# Altium footprint library ACR Components.PcbLib: 45 footprints (part 1 of 3)
Each footprint in its own frame and in the unit in brackets; x right, y up, seen from the top. Pads: shape width x height; smd on the part's side, far side on the other; paste and mask are expansions set on the pad; w line width, h text height; cw(c..) or ccw(c..) is an arc to the next point about the centre after c.
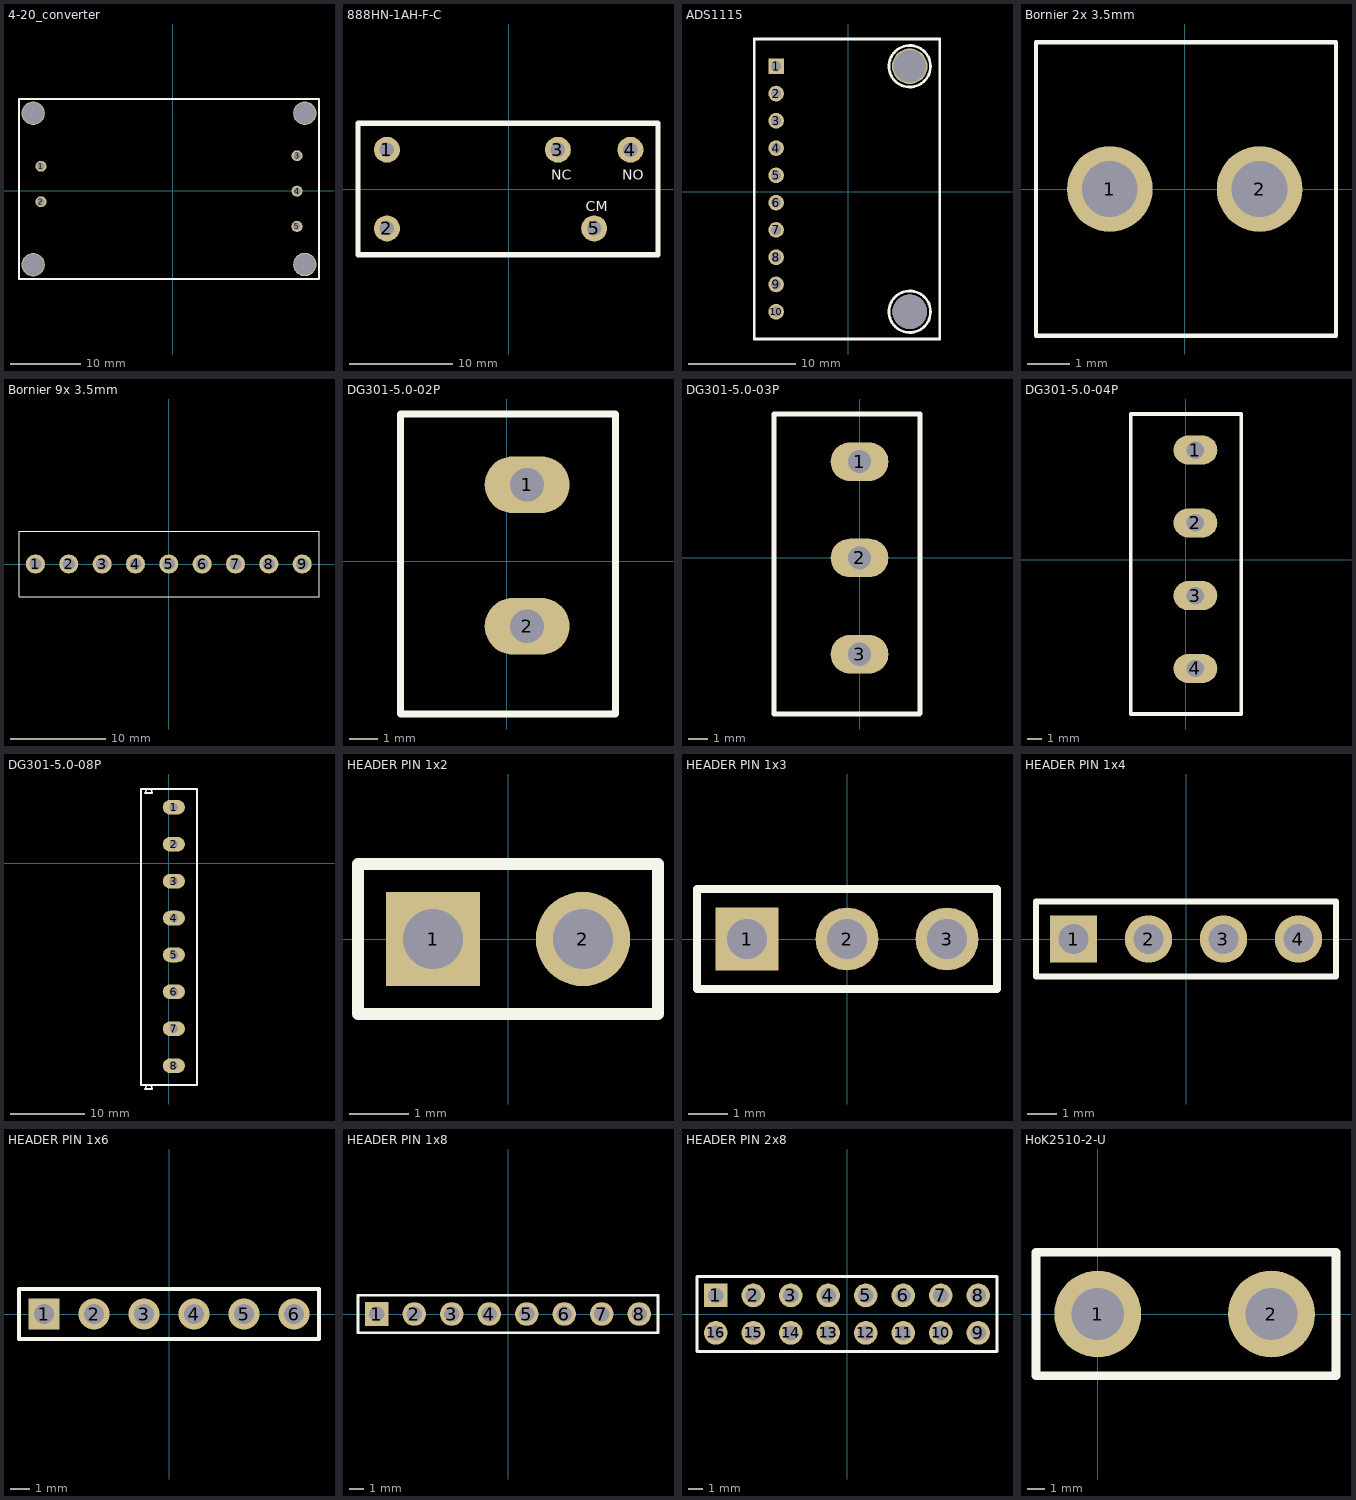
[diagram p0: the footprints below, top view; thin cyan lines are the x and y axes]

## 4-20_converter [mm] "4-20 mA to 0-3.3V, 0-5V, 0-10V Signal Conversion Board"
pads (9):
  oval 1.575x1.524 hole 1.067: 1(-18.625,3.45) 2(-18.625,-1.55) 3(17.575,4.95) 4(17.575,-0.05) 5(17.559,-5.043)
  round 3.3 hole 3: ""(-19.725,-10.45) ""(-19.725,10.95) ""(18.675,-10.425) ""(18.675,10.95)
Top Overlay:
  lines w0.254: -21.725,-12.45 20.675,-12.45 20.675,12.95 -21.725,12.95 -21.725,-12.45
3D body "4-20 mA to 0-3.3V, 0-5V, 0-10V Signal Conversion Board.STEP": height 13.15, standoff -2.7, extent -21.725,-12.45 20.675,12.95

## 888HN-1AH-F-C [mm]
pads (5):
  round 2.5 hole 1.4: 1(-11.75,3.8) 2(-11.75,-3.8) 3(4.75,3.8) 4(11.75,3.8) 5(8.25,-3.8)
Top Overlay:
  lines w0.5: -14.544,-6.34 14.412,-6.34 14.412,6.36 -14.544,6.36 -14.544,-6.34
  text "CM" at 7.425,-2.151 h1
  text "NO" at 10.981,0.897 h1
  text "NC" at 4.123,0.897 h1
3D body "888HN-1AH-F-C.STEP": height 15.9, standoff -3.5, extent -14.566,-6.34 14.434,6.36

## ADS1115 [mil] "16 bit Analog to digital converter"
pads (12):
  rect 57.4x57.4 hole 37.4: 1(-265,460)
  round 57.4 hole 37.4: 2(-265,360) 3(-265,260) 4(-265,160) 5(-265,60) 6(-265,-40) 7(-265,-140) 8(-265,-240) 9(-265,-340) 10(-265,-440)
  round 125.98 hole 125.98: ""(225,-440)
  round 129.92 hole 118.11 unplated: ""(225,460)
Top Overlay:
  circle w10: c225,-440 r76.16
  circle w10: c225,460 r76.16
  lines w10: -345,-540 335,-540 335,560 -345,560 -345,-540
3D body "16Bit I2C ADC+PGA - ADS1115.stp": height 107.88, standoff 0, extent -345,-540 335,560

## Bornier 2x 3.5mm [mm]
pads (2):
  round 2 hole 1.3: 1(-1.75,0) 2(1.75,0)
Top Overlay:
  lines w0.1: -3.477,-3.429 -3.477,3.429 3.538,3.429 3.538,-3.429 -3.477,-3.429
3D body "2x3.5mm.STEP": height 8.8, standoff -3.3, extent -3.473,-3.454 3.527,3.446

## Bornier 9x 3.5mm [mm]
pads (9):
  round 2 hole 1.3: 1(-14,0) 2(-10.5,0) 3(-7,0) 4(-3.5,0) 5(0,0) 6(3.5,0) 7(7,0) 8(10.5,0) 9(14,0)
Top Overlay:
  lines w0.1: -15.727,-3.429 -15.727,3.429 15.769,3.429 15.769,-3.429 -15.727,-3.429
3D body "Bornier 9x3.5mm.STEP": height 8.9, standoff -3.2, extent -15.729,-3.429 15.771,3.471

## DG301-5.0-02P [mm] "PCB terminal blocks"
pads (2):
  oval 3x2 hole 1.2: 1(0.725,2.7) 2(0.725,-2.3)
Top Overlay:
  lines w0.254: -3.75,-5.4 3.85,-5.4 3.85,5.2 -3.75,5.2 -3.75,-5.4
3D body "DG301-5.0-02P-1Y-00A(H).stp": height 10.4, standoff -3.9, extent -3.75,-5.4 3.85,5.2

## DG301-5.0-03P [mm] "PCB terminal blocks"
pads (3):
  oval 3x2 hole 1.2: 1(0,5) 2(0,0) 3(0,-5)
Top Overlay:
  lines w0.254: 3.125,-8.1 -4.45,-8.1 -4.45,7.475 3.15,7.475 3.15,-8.075
3D body "DG301-5.0-03P-1Y-00A(H).stp": height 10.4, standoff -3.9, extent -4.45,-8.125 3.15,7.475

## DG301-5.0-04P [mm] "PCB terminal blocks"
pads (4):
  oval 3x2 hole 1.2: 1(0.675,7.55) 2(0.675,2.55) 3(0.675,-2.45) 4(0.675,-7.45)
Top Overlay:
  lines w0.254: -3.775,-10.575 3.825,-10.575 3.825,-5.525 3.825,10.025 -3.775,10.025 -3.775,-5.55 -3.775,-10.575
3D body "DG301-5.0-04P-1Y-00A(H).stp": height 10.4, standoff -3.9, extent -3.775,-10.575 3.825,10.025

## DG301-5.0-08P [mm] "PCB terminal blocks"
pads (8):
  oval 3x2 hole 1.2: 1(0.675,7.55) 2(0.675,2.55) 3(0.675,-2.45) 4(0.675,-7.45) 5(0.675,-12.425) 6(0.675,-17.425) 7(0.675,-22.425) 8(0.675,-27.425)
Top Overlay:
  lines w0.254: -3,-30.025 -3.2,-30.575 -2.25,-30.575 -2.4,-30.025 ; -3,10.025 -3.2,9.475 -2.25,9.475 -2.4,10.025 ; -3.775,-30.025 3.825,-30.025 3.825,-5.525 3.825,10.025 -3.775,10.025 -3.775,-5.55 -3.775,-30.025
3D body "DG301-5.0-08.stp": height 10, standoff -4.3, extent -3.8,-30.525 3.8,10.075

## HEADER PIN 1x2 [mm]
pads (2):
  rect 1.6x1.6 hole 1.02: 1(-1.27,0)
  round 1.6 hole 1.02: 2(1.27,0)
Top Overlay:
  lines w0.2: -2.54,-1.27 -2.54,1.27 2.54,1.27 2.54,-1.27 -2.54,-1.27
3D body "Pin Headers x2.STEP": height 8.67, standoff -2.13, extent -2.54,-1.27 2.54,1.27

## HEADER PIN 1x3 [mm]
pads (3):
  rect 1.6x1.6 hole 1.02: 1(-2.54,0)
  round 1.6 hole 1.02: 2(0,0) 3(2.54,0)
Top Overlay:
  lines w0.2: -3.81,-1.27 -3.81,1.27 3.81,1.27 3.81,-1.27 -3.81,-1.27
3D body "Pin Headers x3.STEP": height 8.67, standoff -2.13, extent -3.81,-1.27 3.81,1.27

## HEADER PIN 1x4 [mm]
pads (4):
  rect 1.6x1.6 hole 1.02: 1(-3.81,0)
  round 1.6 hole 1.02: 2(-1.27,0) 3(1.27,0) 4(3.81,0)
Top Overlay:
  lines w0.2: -5.08,-1.27 5.08,-1.27 5.08,1.27 -5.08,1.27 -5.08,-1.27
3D body "Pin Headers x4.STEP": height 8.67, standoff -2.13, extent -5.08,-1.27 5.08,1.27

## HEADER PIN 1x6 [mm]
pads (6):
  rect 1.6x1.6 hole 1.02: 1(-6.35,0)
  round 1.6 hole 1.02: 2(-3.81,0) 3(-1.27,0) 4(1.27,0) 5(3.81,0) 6(6.35,0)
Top Overlay:
  lines w0.2: -7.62,-1.27 -7.62,1.27 7.62,1.27 7.62,-1.27 -7.62,-1.27
3D body "Pin Headers x6.STEP": height 8.67, standoff -2.13, extent -7.62,-1.27 7.62,1.27

## HEADER PIN 1x8 [mm]
pads (8):
  rect 1.6x1.6 hole 1.02: 1(-8.89,0)
  round 1.6 hole 1.02: 2(-6.35,0) 3(-3.81,0) 4(-1.27,0) 5(1.27,0) 6(3.81,0) 7(6.35,0) 8(8.89,0)
Top Overlay:
  lines w0.2: -10.16,-1.27 -10.16,1.27 10.16,1.27 10.16,-1.27 -10.16,-1.27
3D body "Pin Headers x8.STEP": height 8.67, standoff -2.13, extent -10.16,-1.27 10.16,1.27

## HEADER PIN 2x8 [mm]
pads (16):
  rect 1.6x1.6 hole 1.02: 1(-8.89,1.27)
  round 1.6 hole 1.02: 2(-6.35,1.27) 3(-3.81,1.27) 4(-1.27,1.27) 5(1.27,1.27) 6(3.81,1.27) 7(6.35,1.27) 8(8.89,1.27) 9(8.89,-1.27) 10(6.35,-1.27) 11(3.81,-1.27) 12(1.27,-1.27) 13(-1.27,-1.27) 14(-3.81,-1.27) 15(-6.35,-1.27) 16(-8.89,-1.27)
Top Overlay:
  lines w0.2: -10.16,-2.515 -10.16,2.54 10.16,2.54 10.16,-2.515 -10.16,-2.515
3D body "Pin Headers x8.STEP": height 8.67, standoff -2.13, extent -10.166,-2.538 10.154,0.002
3D body "Pin Headers x8.STEP": height 8.67, standoff -2.13, extent -10.16,0 10.16,2.54

## HoK2510-2-U [mm] "Resistors/Chip Resistor - Surface Mount"
pads (2):
  round 5 hole 3: 1(0,0) 2(10,0)
Top Overlay:
  lines w0.5: -3.556,-3.556 -3.556,3.556 13.716,3.556 13.716,-3.556 -3.556,-3.556
3D body "HoK2510-2-U.STEP": height 8.25, standoff -3.5, extent -1.6,-1.25 11.601,1.25